# Altium footprint library EwgActive.PCBLIB: 47 footprints (part 1 of 3)
Each footprint in its own frame and in the unit in brackets; x right, y up, seen from the top. Pads: shape width x height; smd on the part's side, far side on the other; paste and mask are expansions set on the pad; w line width, h text height; cw(c..) or ccw(c..) is an arc to the next point about the centre after c.
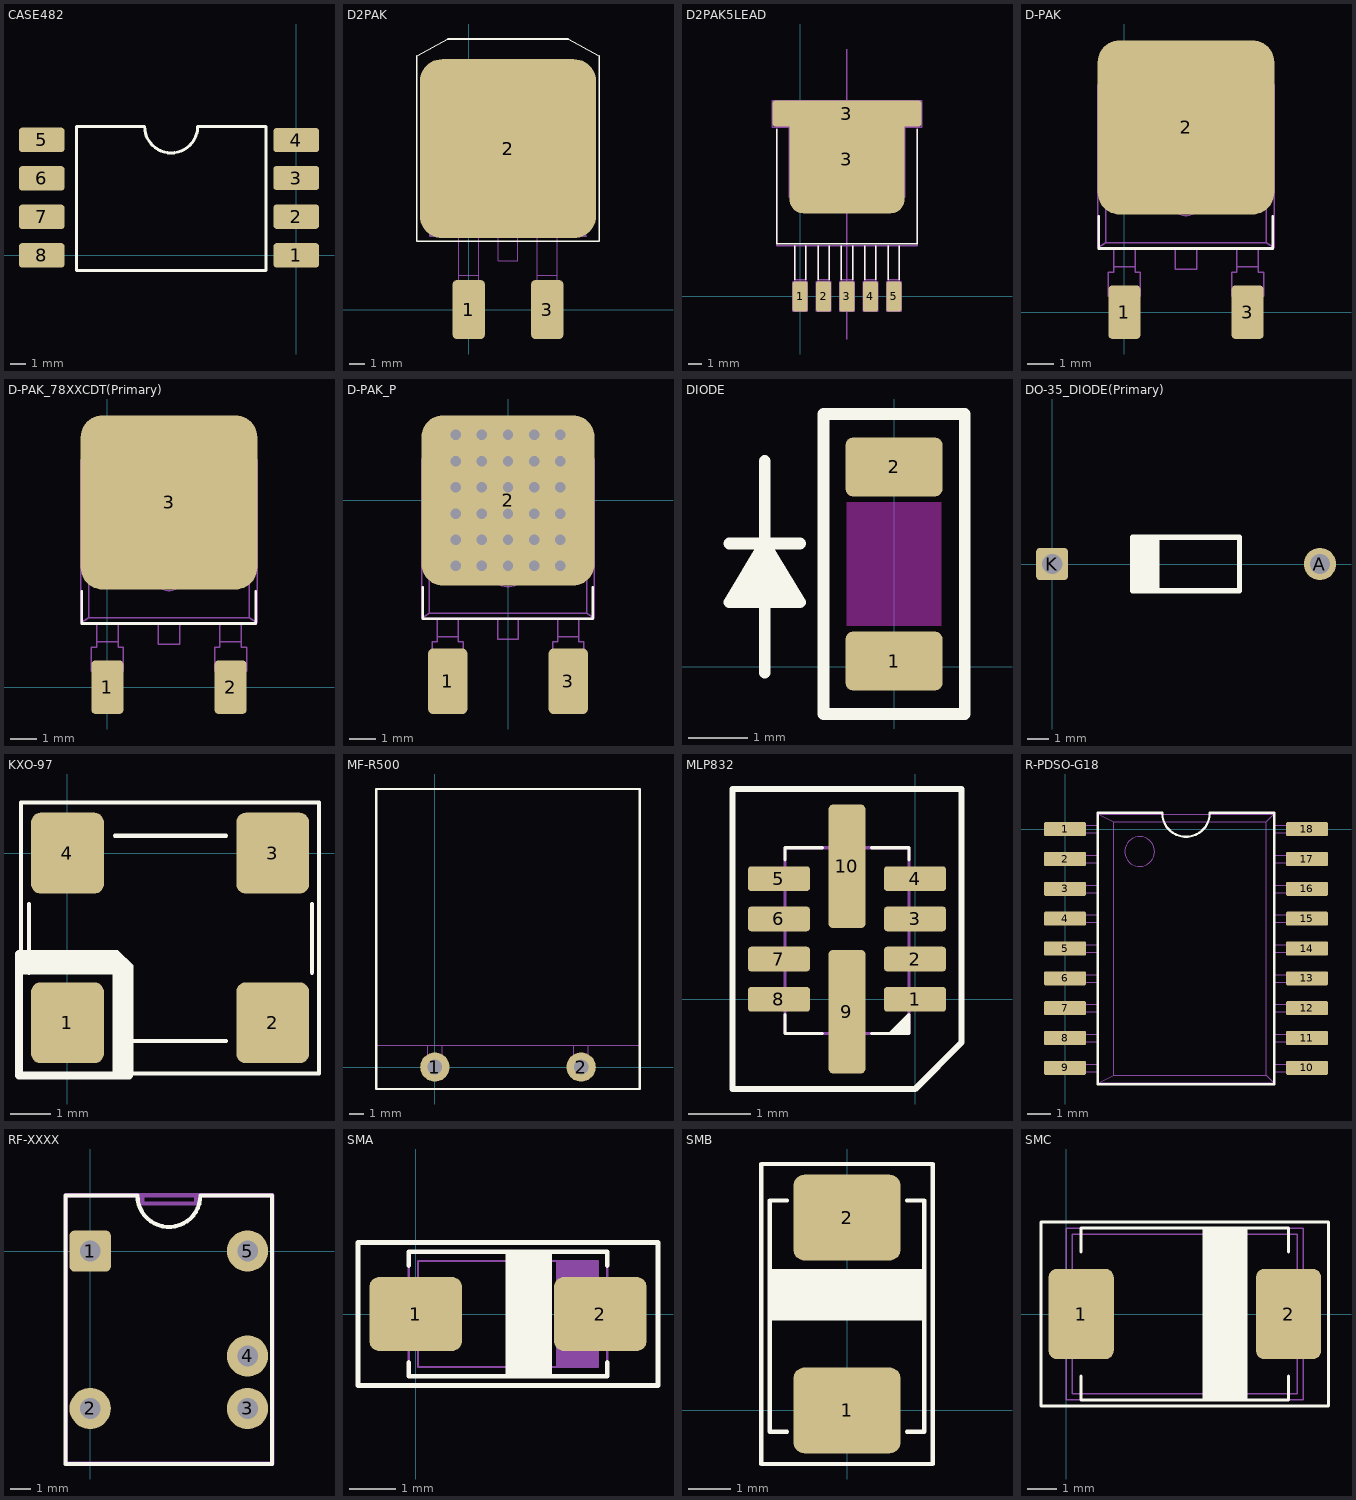
[diagram p0: the footprints below, top view; thin cyan lines are the x and y axes]

## CASE482 [mm]
pads (8):
  rrect25% 3x1.6 smd: 1(0,0) 2(0,2.55) 3(0,5.1) 4(0,7.6) 5(-16.78,7.62) 6(-16.78,5.08) 7(-16.78,2.54) 8(-16.78,0)
Top Overlay:
  lines w0.2: -14.5,-1 -2,-1 -2,8.5 -6.5,8.5 cw(c-8.25,8.5) -10,8.5 -14.5,8.5 -14.5,-1

## D2PAK [mm]
pads (3):
  rrect25% 2.08x3.81 smd: 1(0,0) 3(5.08,0)
  rrect25% 11.4x11.6 smd: 2(2.54,10.42)
Top Overlay:
  lines w0.1: -3.36,4.42 8.44,4.42 8.44,16.42 6.44,17.52 -1.36,17.52 -3.36,16.42 -3.36,4.42
Mechanical 1:
  lines w0.05: -0.635,2.222 0.635,2.222 ; -0.635,4.763 -0.635,1.746 -0.476,1.746 -0.476,-0.635 0.476,-0.635 0.476,1.746 0.635,1.746 0.635,4.763 ; -0.476,0.953 0.476,0.953 ; 1.905,4.763 1.905,3.175 3.175,3.175 3.175,4.763 ; 4.445,2.222 5.715,2.222 ; 4.445,4.763 4.445,1.746 4.604,1.746 4.604,-0.635 5.556,-0.635 5.556,1.746 5.715,1.746 5.715,4.763 ; 4.604,0.953 5.556,0.953 ; -2.54,4.763 7.62,4.763 ; -2.54,4.763 -2.54,13.97 -1.27,14.605 6.35,14.605 7.62,13.97 7.62,4.763 ; -2.54,4.763 -1.905,5.397 ; -1.905,5.397 6.985,5.397 ; -1.905,5.397 -1.905,12.383 ; -1.905,12.383 6.985,12.383 ; -1.905,12.383 -2.54,13.018 7.62,13.018 6.985,12.383 ; 6.985,5.397 6.985,12.383 ; 6.985,5.397 7.62,4.763
3D body: height 4.78, standoff -0.23, extent -2.53,-0.641 7.63,14.623

## D2PAK5LEAD [mm]
height 4.6
pads (7):
  rrect25% 1.07x2.16 smd: 1(0,0) 2(1.7,0) 3(3.4,0) 4(5.1,0) 5(6.8,0)
  rrect25% 8.33x7.8 smd: 3(3.4,9.925)
  rrect25% 10.8x1.91 smd: 3(3.4,13.25)
Top Overlay:
  lines w0.1: -1.7,12.1 -1.7,3.825 8.5,3.825 8.5,12.1 ; -0.4,1.211 -0.4,3.671 ; 0.4,1.211 0.4,3.671 ; 1.3,1.211 1.3,3.671 ; 2.1,1.211 2.1,3.671 ; 3,1.211 3,3.671 ; 3.8,1.211 3.8,3.671 ; 4.7,1.211 4.7,3.671 ; 5.5,1.211 5.5,3.671 ; 6.4,1.211 6.4,3.671 ; 7.2,1.211 7.2,3.671
Mechanical 1:
  lines w0.1: 3.4,-3.08 3.4,17.92 ; -2,12.26 -2,14.17 8.8,14.17 8.8,12.26 7.565,12.26 7.565,7.18 -0.765,7.18 -0.765,12.26 -2,12.26 ; -0.535,-1.08 -0.535,1.08 0.535,1.08 0.535,-1.08 -0.535,-1.08 ; 1.165,-1.08 1.165,1.08 2.235,1.08 2.235,-1.08 1.165,-1.08 ; 2.865,-1.08 2.865,1.08 3.935,1.08 3.935,-1.08 2.865,-1.08 ; 4.565,-1.08 4.565,1.08 5.635,1.08 5.635,-1.08 4.565,-1.08 ; 6.265,-1.08 6.265,1.08 7.335,1.08 7.335,-1.08 6.265,-1.08
Mechanical 3:
  lines w0.1: -0.4,1.211 0.4,1.211 ; 0.86,12.311 0.86,7.231 5.94,7.231 5.94,12.311 ; 1.3,1.211 2.1,1.211 ; 3,1.211 3.8,1.211 ; 4.7,1.211 5.5,1.211 ; 6.4,1.211 7.2,1.211 ; -1.7,12.311 -1.7,13.287 -0.03,13.581 6.83,13.581 8.5,13.287 8.5,12.311 ; -1.7,12.311 -1.7,3.671 8.5,3.671 8.5,12.311 ; -1.7,12.311 8.5,12.311 ; -0.4,-0.769 -0.4,3.671 0.4,3.671 0.4,-0.769 -0.4,-0.769 ; 1.3,-0.769 1.3,3.671 2.1,3.671 2.1,-0.769 1.3,-0.769 ; 3,-0.769 3,3.671 3.8,3.671 3.8,-0.769 3,-0.769 ; 4.7,-0.769 4.7,3.671 5.5,3.671 5.5,-0.769 4.7,-0.769 ; 6.4,-0.769 6.4,3.671 7.2,3.671 7.2,-0.769 6.4,-0.769
3D body: height 4.56, standoff 0, extent -1.68,-0.377 8.48,13.638

## D-PAK [mm]
pads (3):
  rrect25% 1.2x2 smd: 1(0,0) 3(4.6,0)
  rrect25% 6.6x6.5 smd: 2(2.3,6.9)
Top Overlay:
  lines w0.1: -0.96,3.58 -0.96,2.38 5.54,2.38 5.54,3.58
Mechanical 1:
  lines w0.05: -0.4,1.7 0.4,1.7 ; -0.4,2.4 -0.4,1.5 -0.6,1.5 -0.6,0.6 -0.5,0.6 -0.4,0.6 ; -0.4,8.5 -0.4,9.2 0.1,9.2 0.1,9 4.5,9 4.5,9.2 5,9.2 5,8.5 5,8.6 ; 0.4,2.4 0.4,1.5 0.6,1.5 0.6,0.6 0.5,0.6 0.4,0.6 ; 1.9,2.4 1.9,1.6 2.7,1.6 2.7,2.4 ; 4.2,1.7 5,1.7 ; 4.2,2.4 4.2,1.5 4,1.5 4,0.6 4.1,0.6 4.2,0.6 ; 5,2.4 5,1.5 5.2,1.5 5.2,0.6 5.1,0.6 5,0.6 ; -1,2.4 5.6,2.4 ; -1,2.4 -1,8.5 ; -1,2.4 -0.7,2.6 ; -1,8.5 5.6,8.5 ; -1,8.5 -0.7,8.3 ; -0.7,2.6 5.3,2.6 ; -0.7,2.6 -0.7,8.3 ; -0.7,8.3 5.3,8.3 ; -0.4,0.6 0.4,0.6 ; -0.4,0.6 -0.4,-0.3 0.4,-0.3 0.4,0.6 ; 4.2,0.6 5,0.6 ; 4.2,0.6 4.2,-0.3 5,-0.3 5,0.6 ; 5.3,2.6 5.3,8.3 ; 5.3,2.6 5.6,2.4 ; 5.3,8.3 5.6,8.5 ; 5.6,2.4 5.6,8.5 ; 1.7,4.2 ccw(c2.3,4.2) 2.9,4.2 ccw(c2.3,4.2) 1.7,4.2
3D body: height 2.3, standoff -0.01, extent -0.992,-0.405 5.588,9.295

## D-PAK_78XXCDT(Primary) [mm]
pads (3):
  rrect25% 1.2x2 smd: 1(0,0) 2(4.6,0)
  rrect25% 6.6x6.5 smd: 3(2.3,6.9)
Top Overlay:
  lines w0.1: -0.96,3.58 -0.96,2.38 5.54,2.38 5.54,3.58
Mechanical 1:
  lines w0.05: -0.4,1.7 0.4,1.7 ; -0.4,2.4 -0.4,1.5 -0.6,1.5 -0.6,0.6 -0.5,0.6 -0.4,0.6 ; -0.4,8.5 -0.4,9.2 0.1,9.2 0.1,9 4.5,9 4.5,9.2 5,9.2 5,8.5 5,8.6 ; 0.4,2.4 0.4,1.5 0.6,1.5 0.6,0.6 0.5,0.6 0.4,0.6 ; 1.9,2.4 1.9,1.6 2.7,1.6 2.7,2.4 ; 4.2,1.7 5,1.7 ; 4.2,2.4 4.2,1.5 4,1.5 4,0.6 4.1,0.6 4.2,0.6 ; 5,2.4 5,1.5 5.2,1.5 5.2,0.6 5.1,0.6 5,0.6 ; -1,2.4 5.6,2.4 ; -1,2.4 -1,8.5 ; -1,2.4 -0.7,2.6 ; -1,8.5 5.6,8.5 ; -1,8.5 -0.7,8.3 ; -0.7,2.6 5.3,2.6 ; -0.7,2.6 -0.7,8.3 ; -0.7,8.3 5.3,8.3 ; -0.4,0.6 0.4,0.6 ; -0.4,0.6 -0.4,-0.3 0.4,-0.3 0.4,0.6 ; 4.2,0.6 5,0.6 ; 4.2,0.6 4.2,-0.3 5,-0.3 5,0.6 ; 5.3,2.6 5.3,8.3 ; 5.3,2.6 5.6,2.4 ; 5.3,8.3 5.6,8.5 ; 5.6,2.4 5.6,8.5 ; 1.7,4.2 ccw(c2.3,4.2) 2.9,4.2 ccw(c2.3,4.2) 1.7,4.2

## D-PAK_P [mm]
pads (3):
  rrect25% 1.5x2.5 smd: 1(-2.3,-6.9) 3(2.3,-6.9)
  rrect25% 6.6x6.5 all layers, no hole: 2(0,0)
via 0,0.5 diameter 0.6 hole 0.4
via 2,-2.5 diameter 0.6 hole 0.4
via 1,-2.5 diameter 0.6 hole 0.4
via 0,-2.5 diameter 0.6 hole 0.4
via -1,-2.5 diameter 0.6 hole 0.4
via -2,-2.5 diameter 0.6 hole 0.4
via -2,-1.5 diameter 0.6 hole 0.4
via -1,-1.5 diameter 0.6 hole 0.4
via 0,-1.5 diameter 0.6 hole 0.4
via 1,-1.5 diameter 0.6 hole 0.4
via 2,-1.5 diameter 0.6 hole 0.4
via 2,-0.5 diameter 0.6 hole 0.4
via 0,-0.5 diameter 0.6 hole 0.4
via -1,-0.5 diameter 0.6 hole 0.4
via -2,-0.5 diameter 0.6 hole 0.4
via -2,0.5 diameter 0.6 hole 0.4
via -1,0.5 diameter 0.6 hole 0.4
via 1,-0.5 diameter 0.6 hole 0.4
via 2,0.5 diameter 0.6 hole 0.4
via 1,0.5 diameter 0.6 hole 0.4
via 1,1.5 diameter 0.6 hole 0.4
via 2,1.5 diameter 0.6 hole 0.4
via 0,1.5 diameter 0.6 hole 0.4
via -2,1.5 diameter 0.6 hole 0.4
via -1,1.5 diameter 0.6 hole 0.4
via -2,2.5 diameter 0.6 hole 0.4
via -1,2.5 diameter 0.6 hole 0.4
via 0,2.5 diameter 0.6 hole 0.4
via 2,2.5 diameter 0.6 hole 0.4
via 1,2.5 diameter 0.6 hole 0.4
Top Overlay:
  lines w0.1: -3.26,-3.32 -3.26,-4.52 3.24,-4.52 3.24,-3.32
Mechanical 1:
  lines w0.05: -2.7,-5.2 -1.9,-5.2 ; -2.7,-4.5 -2.7,-5.4 -2.9,-5.4 -2.9,-6.3 -2.8,-6.3 -2.7,-6.3 ; -2.7,1.6 -2.7,2.3 -2.2,2.3 -2.2,2.1 2.2,2.1 2.2,2.3 2.7,2.3 2.7,1.6 2.7,1.7 ; -1.9,-4.5 -1.9,-5.4 -1.7,-5.4 -1.7,-6.3 -1.8,-6.3 -1.9,-6.3 ; -0.4,-4.5 -0.4,-5.3 0.4,-5.3 0.4,-4.5 ; 1.9,-5.2 2.7,-5.2 ; 1.9,-4.5 1.9,-5.4 1.7,-5.4 1.7,-6.3 1.8,-6.3 1.9,-6.3 ; 2.7,-4.5 2.7,-5.4 2.9,-5.4 2.9,-6.3 2.8,-6.3 2.7,-6.3 ; -3.3,-4.5 -3,-4.3 ; -3.3,-4.5 -3.3,1.6 ; -3.3,-4.5 3.3,-4.5 ; -3.3,1.6 -3,1.4 ; -3.3,1.6 3.3,1.6 ; -3,-4.3 -3,1.4 ; -3,-4.3 3,-4.3 ; -3,1.4 3,1.4 ; -2.7,-6.3 -2.7,-7.2 -1.9,-7.2 -1.9,-6.3 ; -2.7,-6.3 -1.9,-6.3 ; 1.9,-6.3 1.9,-7.2 2.7,-7.2 2.7,-6.3 ; 1.9,-6.3 2.7,-6.3 ; 3,-4.3 3.3,-4.5 ; 3,-4.3 3,1.4 ; 3,1.4 3.3,1.6 ; 3.3,-4.5 3.3,1.6 ; -0.6,-2.7 cw(c0,-2.7) 0.6,-2.7 cw(c0,-2.7) -0.6,-2.7
3D body: height 2.3, standoff -0.01, extent -3.292,-7.305 3.288,2.395

## DIODE [mm]
pads (2):
  rrect25% 1.65x1 smd: 1(0,0.1) 2(0,3.4)
Top Layer keep-out:
  region: -0.8,0.7 0.8,0.7 0.8,2.8 -0.8,2.8
Mid-Layer 2:
  region: -0.5,3.25 -0.5,2.75 0.5,2.75 0.5,3.25
  lines w0.1: -0.5,0.75 0.5,0.75 ; -0.5,2.75 0.5,2.75 ; -0.5,0.25 0.5,0.25 0.5,3.25 -0.5,3.25 -0.5,0.25
Top Overlay:
  region: -2.8,1.1 -1.6,1.1 -2.2,2.1
  lines w0.2: -2.8,2.1 -1.6,2.1 ; -2.2,-0.1 -2.2,3.5 ; -2.8,1.1 -1.6,1.1 -2.2,2.1 -2.8,1.1 ; -1.2,-0.8 1.2,-0.8 1.2,4.3 -1.2,4.3 -1.2,-0.8

## DO-35_DIODE(Primary) [mil]
pads (2):
  round 60 hole 38: A(500,0)
  rrect25% 60x60 hole 38: K(0,0)
Top Overlay:
  region: 150,-50 200,-50 200,50 150,50
  region: 150,-50 175,-50
  lines w10: 150,-50 150,50 350,50 350,-50 150,-50

## KXO-97 [mm]
pads (4):
  rrect25% 1.8x2 smd: 1(0,-4.2) 2(5.08,-4.2) 3(5.08,0) 4(0,0)
Top Overlay:
  region: -1.15,-3 1.125,-3 1.125,-5.45 1.625,-5.45 1.625,-2.775 1.25,-2.4 -1.15,-2.4
  lines w0.1: -0.95,-2.96 -0.95,-1.26 ; 1.175,-4.65 3.925,-4.65 ; 1.175,0.43 3.925,0.43 ; 6.05,-2.96 6.05,-1.26 ; -1.15,-5.45 -1.15,1.25 6.225,1.25 6.225,-5.45 -1.125,-5.45 -1.15,-5.45
  lines w0.2: -1.2,-2.5 -1.2,-5.5 1.525,-5.5
3D body: height 1.8, standoff 0, extent -0.95,-4.65 6.05,0.43

## MF-R500 [mm]
pads (2):
  round 2 hole 1: 1(0,0) 2(10,0)
Top Overlay:
  lines w0.15: -4,-1.5 -4,19 14,19 14,-1.5 -4,-1.5
Mechanical 1:
  lines w0.05: -0.5,0 -0.5,1.5 ; 0.5,0 0.5,1.5 ; 9.5,0 9.5,1.5 ; 10.5,0 10.5,1.5 ; -4,1.5 -4,19 14,19 14,1.5 -4,1.5

## MLP832 [mm]
pads (10):
  rrect25% 1x0.4 smd: 1(0,0) 2(0,0.65) 3(0,1.3) 4(0,1.95) 5(-2.2,1.95) 6(-2.2,1.3) 7(-2.2,0.65) 8(-2.2,0)
  rrect25% 0.6x2 smd: 9(-1.1,-0.2) 10(-1.1,2.15)
Top Overlay:
  lines w0.05: -2.1,-0.25 -2.1,-0.55 -1.5,-0.55 ; -2.1,2.25 -2.1,2.45 -1.5,2.45 ; -0.7,-0.55 -0.1,-0.55 -0.1,-0.25 -0.4,-0.55 ; -0.7,2.45 -0.1,2.45 -0.1,2.25 ; -0.35,-0.55 -0.1,-0.3 ; -0.3,-0.55 -0.1,-0.35 ; -0.25,-0.55 -0.1,-0.4 ; -0.2,-0.55 -0.1,-0.45 ; -0.15,-0.55 -0.1,-0.5
  lines w0.1: -2.95,-1.45 0,-1.45 0.75,-0.7 0.75,3.4 -2.95,3.4 -2.95,-1.45
Mechanical 1:
  lines w0.05: -2.1,-0.15 -2.25,-0.15 -2.25,0.15 -2.1,0.15 ; -2.1,0.5 -2.25,0.5 -2.25,0.8 -2.1,0.8 ; -2.1,1.15 -2.25,1.15 -2.25,1.45 -2.1,1.45 ; -2.1,1.8 -2.25,1.8 -2.25,2.1 -2.1,2.1 ; -1.25,-0.55 -1.25,-0.7 -0.95,-0.7 -0.95,-0.55 ; -1.25,2.45 -1.25,2.6 -0.95,2.6 -0.95,2.45 ; -0.1,-0.15 0.05,-0.15 0.05,0.15 -0.1,0.15 ; -0.1,0.5 0.05,0.5 0.05,0.8 -0.1,0.8 ; -0.1,1.15 0.05,1.15 0.05,1.45 -0.1,1.45 ; -0.1,1.8 0.05,1.8 0.05,2.1 -0.1,2.1 ; -2.1,-0.55 -0.1,-0.55 -0.1,2.45 -2.1,2.45 -2.1,-0.55
3D body: height 0.92, standoff 0.03, extent -2.2,-0.65 0,2.55

## R-PDSO-G18 [mm]
pads (18):
  rrect25% 1.8x0.6 smd: 1(0,0) 2(0,-1.27) 3(0,-2.54) 4(0,-3.81) 5(0,-5.08) 6(0,-6.35) 7(0,-7.62) 8(0,-8.89) 9(0,-10.16) 10(10.3,-10.16) 11(10.3,-8.89) 12(10.3,-7.62) 13(10.3,-6.35) 14(10.3,-5.08) 15(10.3,-3.81) 16(10.3,-2.54) 17(10.3,-1.27) 18(10.3,0)
Top Overlay:
  lines w0.1: 1.4,-10.855 8.9,-10.855 8.9,0.695 6.166,0.695 cw(c5.15,0.695) 4.134,0.695 1.4,0.695 1.4,-10.855
Mechanical 1:
  circle w0.05: c3.175,-0.953 r0.635
  lines w0.05: 0.794,-10.319 0.794,-10.001 ; 0.794,-9.049 0.794,-8.731 ; 0.794,-7.779 0.794,-7.461 ; 0.794,-6.509 0.794,-6.191 ; 0.794,-5.239 0.794,-4.921 ; 0.794,-3.969 0.794,-3.651 ; 0.794,-2.699 0.794,-2.381 ; 0.794,-1.429 0.794,-1.111 ; 0.794,-0.159 0.794,0.159 ; 1.429,-10.319 0,-10.319 0,-10.001 1.429,-10.001 ; 1.429,-9.049 0,-9.049 0,-8.731 1.429,-8.731 ; 1.429,-7.779 0,-7.779 0,-7.461 1.429,-7.461 ; 1.429,-6.509 0,-6.509 0,-6.191 1.429,-6.191 ; 1.429,-5.239 0,-5.239 0,-4.921 1.429,-4.921 ; 1.429,-3.969 0,-3.969 0,-3.651 1.429,-3.651 ; 1.429,-2.699 0,-2.699 0,-2.381 1.429,-2.381 ; 1.429,-1.429 0,-1.429 0,-1.111 1.429,-1.111 ; 1.429,-0.159 0,-0.159 0,0.159 1.429,0.159 ; 8.89,-10.319 10.319,-10.319 10.319,-10.001 8.89,-10.001 ; 8.89,-9.049 10.319,-9.049 10.319,-8.731 8.89,-8.731 ; 8.89,-7.779 10.319,-7.779 10.319,-7.461 8.89,-7.461 ; 8.89,-6.509 10.319,-6.509 10.319,-6.191 8.89,-6.191 ; 8.89,-5.239 10.319,-5.239 10.319,-4.921 8.89,-4.921 ; 8.89,-3.969 10.319,-3.969 10.319,-3.651 8.89,-3.651 ; 8.89,-2.699 10.319,-2.699 10.319,-2.381 8.89,-2.381 ; 8.89,-1.429 10.319,-1.429 10.319,-1.111 8.89,-1.111 ; 8.89,-0.159 10.319,-0.159 10.319,0.159 8.89,0.159 ; 9.525,-10.319 9.525,-10.001 ; 9.525,-9.049 9.525,-8.731 ; 9.525,-7.779 9.525,-7.461 ; 9.525,-6.509 9.525,-6.191 ; 9.525,-5.239 9.525,-4.921 ; 9.525,-3.969 9.525,-3.651 ; 9.525,-2.699 9.525,-2.381 ; 9.525,-1.429 9.525,-1.111 ; 9.525,-0.159 9.525,0.159 ; 1.429,-10.795 8.89,-10.795 ; 1.429,-10.795 1.429,0.635 ; 1.429,-10.795 2.064,-10.477 ; 1.429,0.635 8.89,0.635 ; 1.429,0.635 2.064,0.318 ; 2.064,-10.477 8.572,-10.477 ; 2.064,-10.477 2.064,0.318 ; 2.064,0.318 8.572,0.318 ; 8.572,-10.477 8.572,0.318 ; 8.572,-10.477 8.89,-10.795 ; 8.572,0.318 8.89,0.635 ; 8.89,-10.795 8.89,0.635
3D body: height 2.57, standoff -0.03, extent -0.125,-10.975 10.475,0.775

## RF-XXXX [mm]
pads (5):
  rrect25% 2x2 hole 1: 1(0,0)
  round 2 hole 1: 2(0,-7.62) 3(7.62,-7.62) 4(7.62,-5.08) 5(7.62,0)
Top Overlay:
  lines w0.2: -1.19,-10.31 8.81,-10.31 8.81,2.69 5.334,2.69 cw(c3.81,2.69) 2.286,2.69 -1.19,2.69 -1.19,-10.31
Mechanical 1:
  lines w0.2: 2.52,2.7 2.52,2.3 5.12,2.3 5.12,2.7 ; -1.18,-10.3 8.82,-10.3 8.82,2.7 -1.18,2.7 -1.18,-10.3

## SMA [mm]
pads (2):
  rrect25% 2x1.6 smd: 1(0,0) 2(4,0)
Top Overlay:
  region: 2.95,1.35 2.95,-1.35 1.95,-1.35 1.85,-1.35 1.95,-1.35 1.95,1.35
  lines w0.1: -0.15,-1.05 -0.15,-1.35 4.15,-1.35 4.15,-1.05 ; -0.15,1.05 -0.15,1.35 4.15,1.35 4.15,1.05 ; -1.25,-1.55 5.25,-1.55 5.25,1.55 -1.25,1.55 -1.25,-1.55
Mechanical 1:
  region: 3.05,1.15 3.05,-1.15 3.95,-1.15 3.95,1.15
  lines w0.05: -0.15,-0.75 -0.45,-0.75 -0.45,0.75 -0.15,0.75 ; 4.15,-0.75 4.45,-0.75 4.45,0.75 4.15,0.75 ; -0.15,-1.35 -0.15,1.35 4.15,1.35 4.15,-1.35 -0.15,-1.35 ; 0.05,-1.15 0.05,1.15 3.95,1.15 3.95,-1.15 0.05,-1.15
3D body: height 2.4, standoff 0, extent -0.6,-1.3 4.6,1.3

## SMB [mm]
pads (2):
  rrect25% 2.5x2 smd: 1(0,0) 2(0,4.5)
Top Overlay:
  rectangle: -1.8,2.1 1.8,3.3
  lines w0.1: -1.4,-0.5 -1.8,-0.5 -1.8,4.9 -1.4,4.9 ; 1.4,-0.5 1.8,-0.5 1.8,4.9 1.4,4.9 ; -2,-1.25 2,-1.25 2,5.75 -2,5.75 -2,-1.25
3D body: height 2.3, standoff 0, extent -1.8,-0.5 1.8,4.9

## SMC [mm]
pads (2):
  rrect25% 2.2x3.05 smd: 1(0.5,0) 2(7.5,0)
Top Overlay:
  region: 4.6,2.9 4.6,-2.9 6.1,-2.9 6.1,2.9
  lines w0.1: 0.5,-2.1 0.5,-2.9 7.5,-2.9 7.5,-2.1 ; 0.5,2.1 0.5,2.9 7.5,2.9 7.5,2.1 ; -0.85,-3.1 8.85,-3.1 8.85,3.1 -0.85,3.1 -0.85,-3.1
Mechanical 1:
  lines w0.05: 0,-2.9 8,-2.9 8,2.9 0,2.9 0,0 0,-2.9 ; 0.2,-2.7 7.8,-2.7 7.8,-1.3 cw(c7.8,0) 7.8,1.3 7.8,2.7 0.2,2.7 0.2,-2.7
3D body: height 2.3, standoff 0, extent 0.03,-2.95 7.98,2.95